# Altium schematic symbol library SparkFun.SCHLIB: 796 symbols (part 2 of 5)
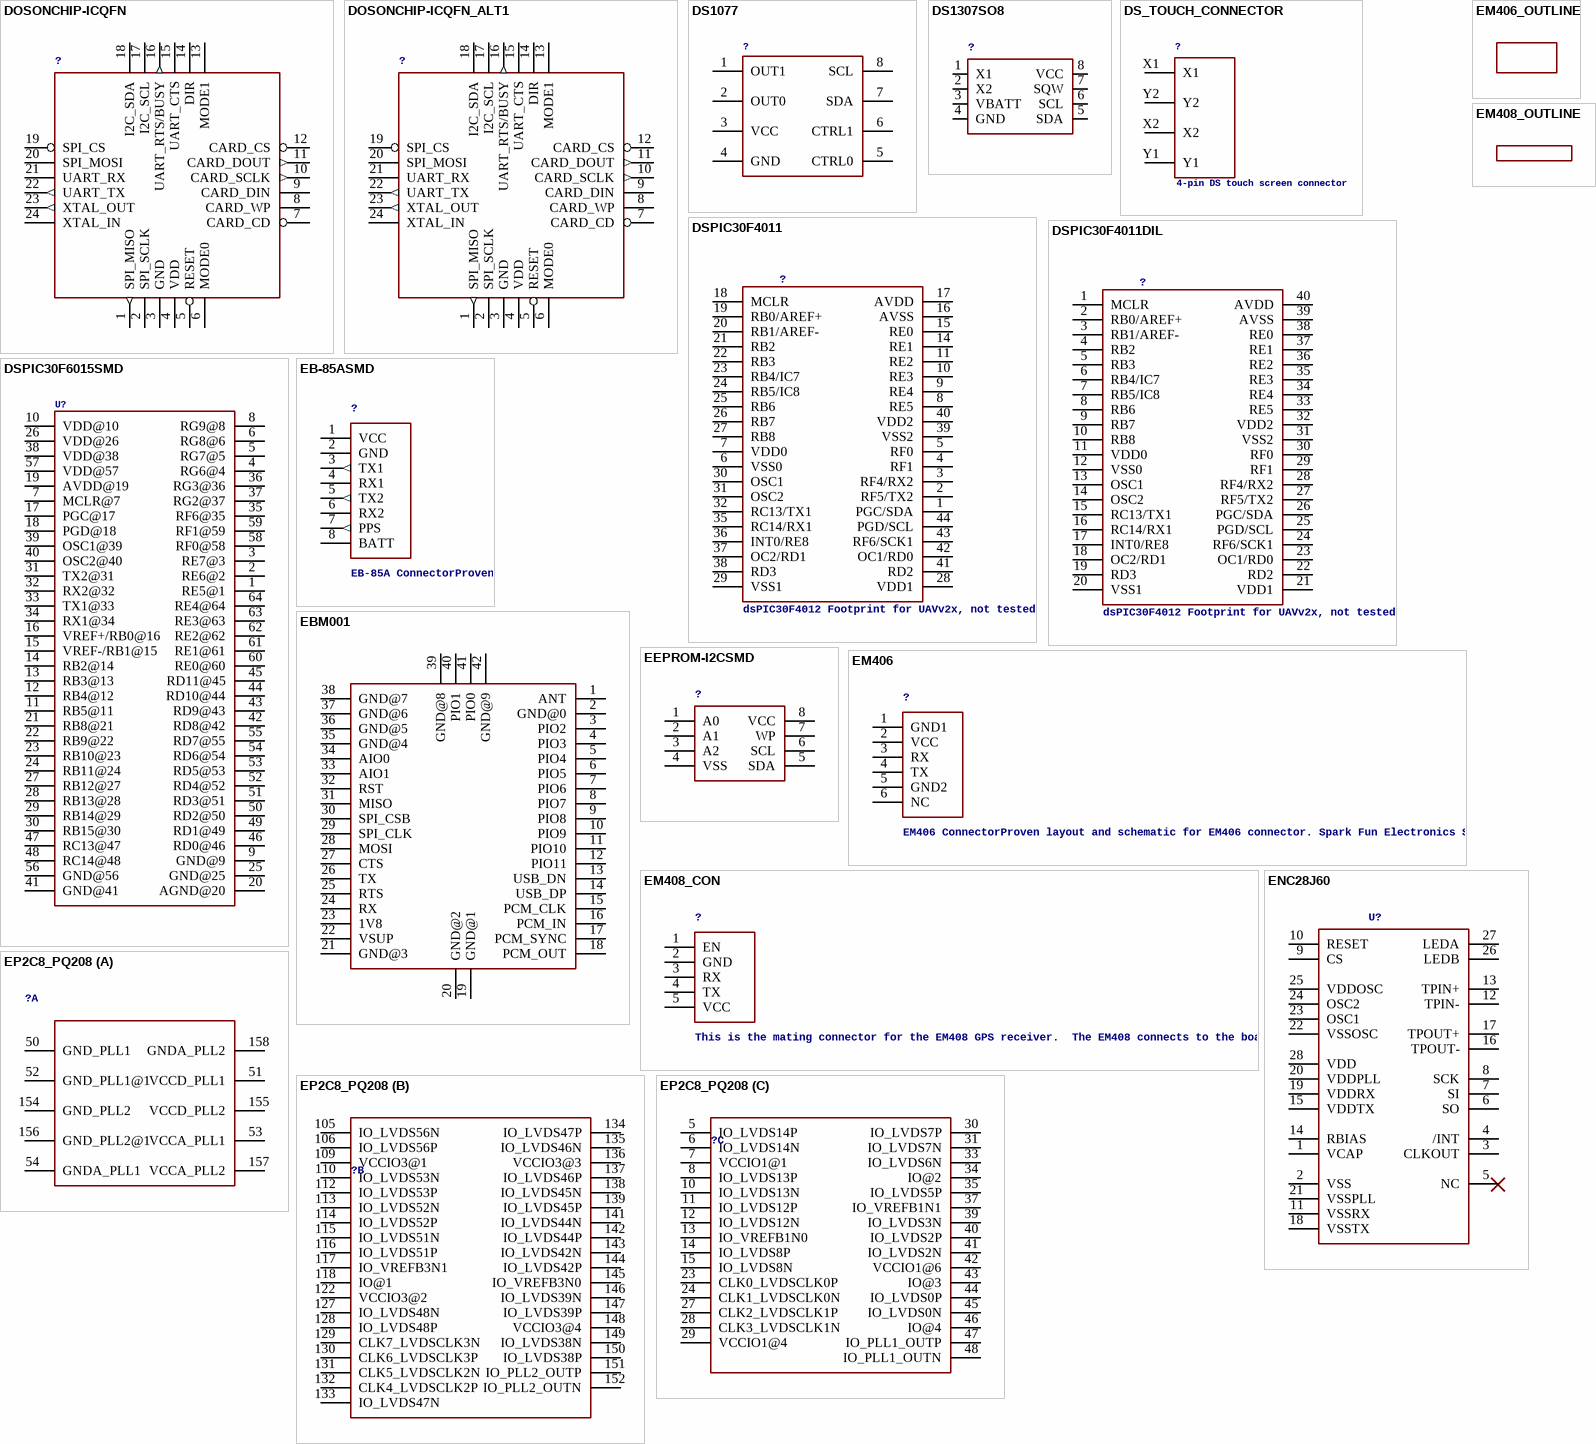
[diagram p37: symbols DOSONCHIP-ICQFN to EP2C8_PQ208]

## DOSONCHIP-ICQFN
designator ?, comment DOSonCHIP ICThis is the tested schematic and footprint for the DOSonCHIP FAT16 FAT32 IC. Spark Fun Electronics SKU : COM-07956. QFN package also tested/proven.  (value not drawn)
footprint QFN-24
pins: 1 SPI_MISO (out), 2 SPI_SCLK, 3 GND, 4 VDD, 5 RESET, 6 MODE0, 7 CARD_CD, 8 CARD_WP, 9 CARD_DIN, 10 CARD_SCLK (out), 11 CARD_DOUT (out), 12 CARD_CS, 13 MODE1, 14 DIR, 15 UART_CTS, 16 UART_RTS/BUSY (out), 17 I2C_SCL, 18 I2C_SDA, 19 SPI_CS, 20 SPI_MOSI, 21 UART_RX, 22 UART_TX (out), 23 XTAL_OUT (out), 24 XTAL_IN

## DOSONCHIP-ICQFN_ALT1
designator ?, comment DOSonCHIP ICThis is the tested schematic and footprint for the DOSonCHIP FAT16 FAT32 IC. Spark Fun Electronics SKU : COM-07956. QFN package also tested/proven.  (value not drawn)
footprint QFN-24_ALT1.PAC
pins: 1 SPI_MISO (out), 2 SPI_SCLK, 3 GND, 4 VDD, 5 RESET, 6 MODE0, 7 CARD_CD, 8 CARD_WP, 9 CARD_DIN, 10 CARD_SCLK (out), 11 CARD_DOUT (out), 12 CARD_CS, 13 MODE1, 14 DIR, 15 UART_CTS, 16 UART_RTS/BUSY (out), 17 I2C_SCL, 18 I2C_SDA, 19 SPI_CS, 20 SPI_MOSI, 21 UART_RX, 22 UART_TX (out), 23 XTAL_OUT (out), 24 XTAL_IN

## DS1077
designator ?
footprint SO08
pins: 1 OUT1, 2 OUT0, 3 VCC, 4 GND, 5 CTRL0, 6 CTRL1, 7 SDA, 8 SCL

## DS1307SO8
designator ?
footprint SO08
pins: 1 X1, 2 X2, 3 VBATT, 4 GND, 5 SDA, 6 SCL, 7 SQW, 8 VCC

## DS_TOUCH_CONNECTOR
designator ?, comment 4-pin DS touch screen connector
footprint DS_TOUCH_CONNECTOR
pins: X1, X2, Y1, Y2

## DSPIC30F4011
designator ?, comment dsPIC30F4012 Footprint for UAVv2x, not tested
footprint TQFP44
pins: 1 PGC/SDA, 2 RF5/TX2, 3 RF4/RX2, 4 RF1, 5 RF0, 6 VSS0, 7 VDD0, 8 RE5, 9 RE4, 10 RE3, 11 RE2, 14 RE1, 15 RE0, 16 AVSS, 17 AVDD, 18 MCLR, 19 RB0/AREF+, 20 RB1/AREF-, 21 RB2, 22 RB3, 23 RB4/IC7, 24 RB5/IC8, 25 RB6, 26 RB7, 27 RB8, 28 VDD1, 29 VSS1, 30 OSC1, 31 OSC2, 32 RC13/TX1, 35 RC14/RX1, 36 INT0/RE8, 37 OC2/RD1, 38 RD3, 39 VSS2, 40 VDD2, 41 RD2, 42 OC1/RD0, 43 RF6/SCK1, 44 PGD/SCL

## DSPIC30F4011DIL
designator ?, comment dsPIC30F4012 Footprint for UAVv2x, not tested
footprint DIL40
pins: 1 MCLR, 2 RB0/AREF+, 3 RB1/AREF-, 4 RB2, 5 RB3, 6 RB4/IC7, 7 RB5/IC8, 8 RB6, 9 RB7, 10 RB8, 11 VDD0, 12 VSS0, 13 OSC1, 14 OSC2, 15 RC13/TX1, 16 RC14/RX1, 17 INT0/RE8, 18 OC2/RD1, 19 RD3, 20 VSS1, 21 VDD1, 22 RD2, 23 OC1/RD0, 24 RF6/SCK1, 25 PGD/SCL, 26 PGC/SDA, 27 RF5/TX2, 28 RF4/RX2, 29 RF1, 30 RF0, 31 VSS2, 32 VDD2, 33 RE5, 34 RE4, 35 RE3, 36 RE2, 37 RE1, 38 RE0, 39 AVSS, 40 AVDD

## DSPIC30F6015SMD
designator U?
footprint TQFP64
pins: 1 RE5@1, 2 RE6@2, 3 RE7@3, 4 RG6@4, 5 RG7@5, 6 RG8@6, 7 MCLR@7, 8 RG9@8, 9 GND@9, 10 VDD@10, 11 RB5@11, 12 RB4@12, 13 RB3@13, 14 RB2@14, 15 VREF-/RB1@15, 16 VREF+/RB0@16, 17 PGC@17, 18 PGD@18, 19 AVDD@19, 20 AGND@20, 21 RB8@21, 22 RB9@22, 23 RB10@23, 24 RB11@24, 25 GND@25, 26 VDD@26, 27 RB12@27, 28 RB13@28, 29 RB14@29, 30 RB15@30, 31 TX2@31, 32 RX2@32, 33 TX1@33, 34 RX1@34, 35 RF6@35, 36 RG3@36, 37 RG2@37, 38 VDD@38, 39 OSC1@39, 40 OSC2@40, 41 GND@41, 42 RD8@42, 43 RD9@43, 44 RD10@44, 45 RD11@45, 46 RD0@46, 47 RC13@47, 48 RC14@48, 49 RD1@49, 50 RD2@50, 51 RD3@51, 52 RD4@52, 53 RD5@53, 54 RD6@54, 55 RD7@55, 56 GND@56, 57 VDD@57, 58 RF0@58, 59 RF1@59, 60 RE0@60, 61 RE1@61, 62 RE2@62, 63 RE3@63, 64 RE4@64

## EB-85ASMD
designator ?, comment EB-85A ConnectorProven layout and schematic for ETek 5Hz GPS receiver connector. Spark Fun Electronics SKU : GPS-08297
footprint EB-85A
pins: 1 VCC (power), 2 GND (power), 3 TX1 (out), 4 RX1, 5 TX2 (out), 6 RX2, 7 PPS (out), 8 BATT (power)

## EBM001
designator ?
footprint EMB001
pins: 1 ANT, 2 GND@0, 3 PIO2, 4 PIO3, 5 PIO4, 6 PIO5, 7 PIO6, 8 PIO7, 9 PIO8, 10 PIO9, 11 PIO10, 12 PIO11, 13 USB_DN, 14 USB_DP, 15 PCM_CLK, 16 PCM_IN, 17 PCM_SYNC, 18 PCM_OUT, 19 GND@1, 20 GND@2, 21 GND@3, 22 VSUP, 23 1V8, 24 RX, 25 RTS, 26 TX, 27 CTS, 28 MOSI, 29 SPI_CLK, 30 SPI_CSB, 31 MISO, 32 RST, 33 AIO1, 34 AIO0, 35 GND@4, 36 GND@5, 37 GND@6, 38 GND@7, 39 GND@8, 40 PIO1, 41 PIO0, 42 GND@9

## EEPROM-I2CSMD
designator ?
footprint SO08
pins: 1 A0, 2 A1, 3 A2, 4 VSS (power), 5 SDA, 6 SCL, 7 WP, 8 VCC (power)

## EM406
designator ?, comment EM406 ConnectorProven layout and schematic for EM406 connector. Spark Fun Electronics SKU : GPS-00579
footprint EM406
pins: 1 GND1, 2 VCC, 3 RX, 4 TX, 5 GND2, 6 NC

## EM406_OUTLINE
designator ?
footprint EM406_OUTLINE

## EM408_CON
designator ?, comment This is the mating connector for the EM408 GPS receiver.  The EM408 connects to the board via a cable, this connector footprint does not include the outline of the receiver. You should include the "EM408_Outline" device in your schematic if you are to use the EM408 in your design.
footprint EM408_CON
pins: 1 EN, 2 GND, 3 RX, 4 TX, 5 VCC

## EM408_OUTLINE
designator ?, comment This device is only the outline of the EM408 GPS receiver.  The device is intended to give the designer an idea of what how the receiver will fit on the board.  THIS DEVICE DOES NOT PROVIDE ANY ELECTRICAL CONNECTION TO THE BOARD!  Include the "EM408_CON" device in order to connect the EM408 to your design.  (value not drawn)
footprint EM408_OUTLINE

## ENC28J60
designator U?
footprint SSOP28DB
pins: 1 VCAP, 2 VSS, 3 CLKOUT, 4 /INT, 5 NC, 6 SO, 7 SI, 8 SCK, 9 CS, 10 RESET, 11 VSSRX, 12 TPIN-, 13 TPIN+, 14 RBIAS, 15 VDDTX, 16 TPOUT-, 17 TPOUT+, 18 VSSTX, 19 VDDRX, 20 VDDPLL, 21 VSSPLL, 22 VSSOSC, 23 OSC1, 24 OSC2, 25 VDDOSC, 26 LEDB, 27 LEDA, 28 VDD

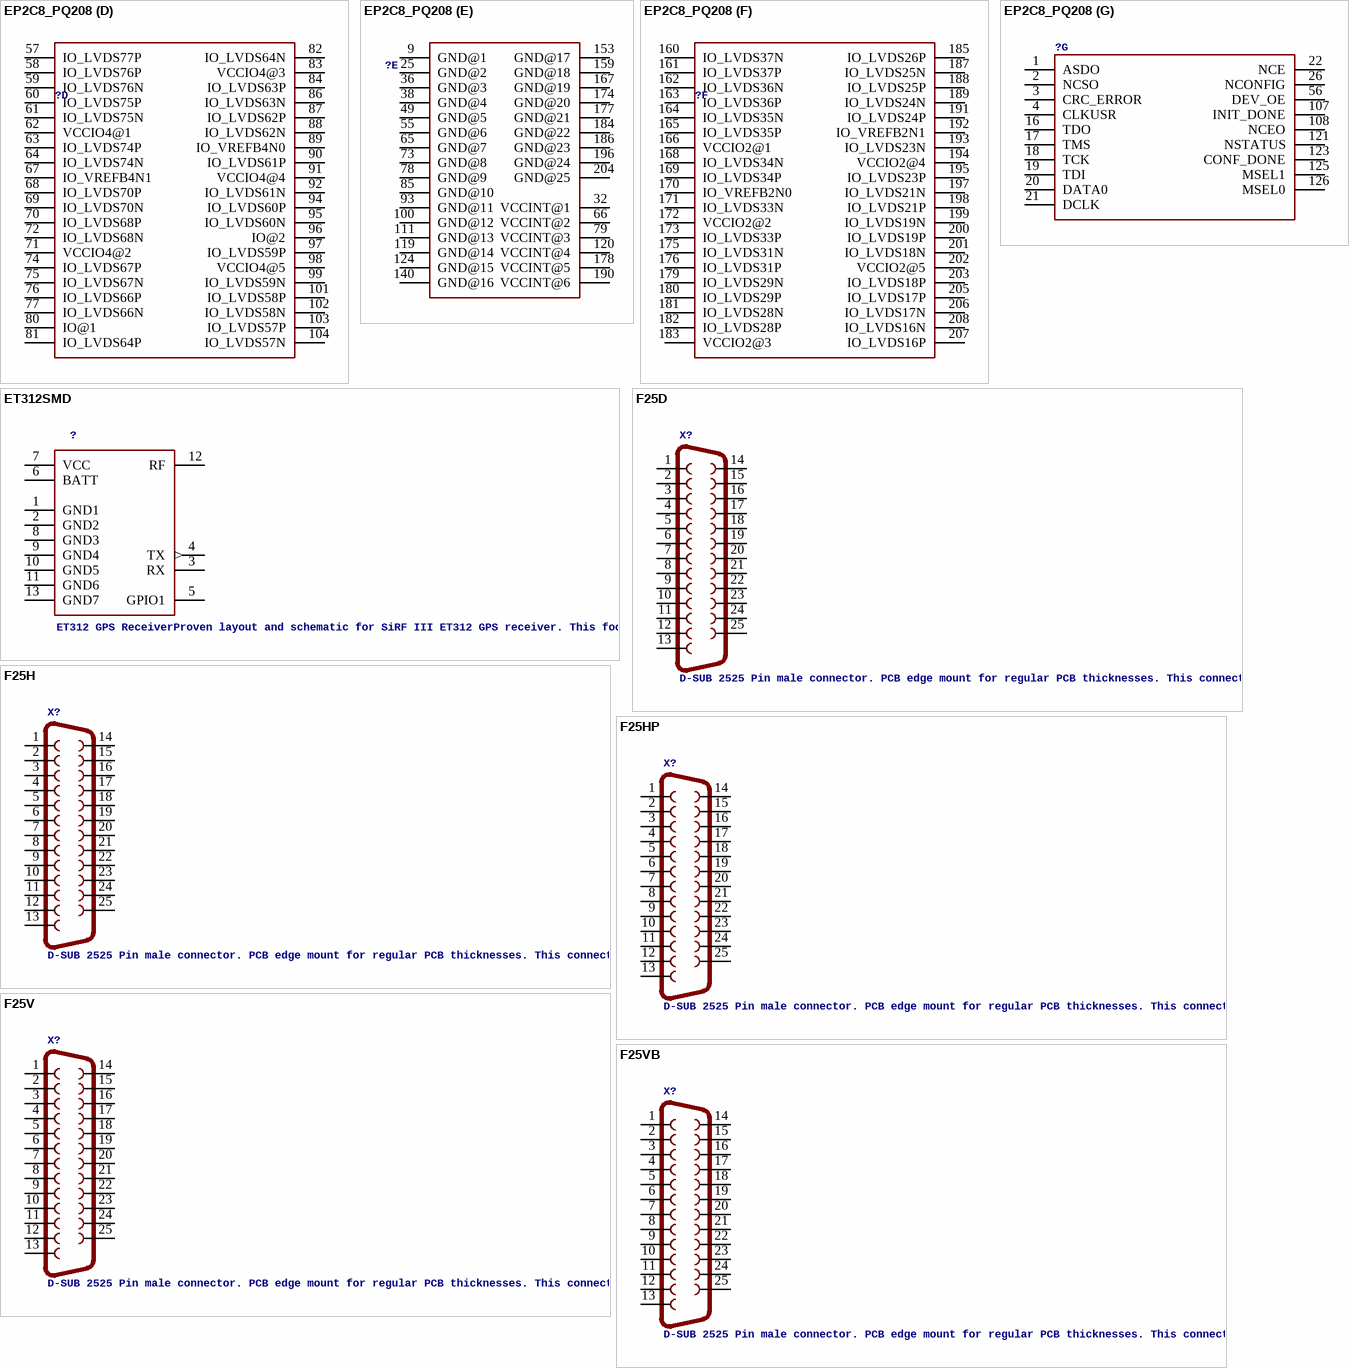
[diagram p12: symbols EP2C8_PQ208 to F25VB]

## EP2C8_PQ208
designator ?
footprint PQFP208
part A pins: 50 GND_PLL1 (power), 51 VCCD_PLL1 (power), 52 GND_PLL1@1 (power), 53 VCCA_PLL1 (power), 54 GNDA_PLL1 (power), 154 GND_PLL2 (power), 155 VCCD_PLL2 (power), 156 GND_PLL2@1 (power), 157 VCCA_PLL2 (power), 158 GNDA_PLL2 (power)
part B pins: 105 IO_LVDS56N, 106 IO_LVDS56P, 109 VCCIO3@1, 110 IO_LVDS53N, 112 IO_LVDS53P, 113 IO_LVDS52N, 114 IO_LVDS52P, 115 IO_LVDS51N, 116 IO_LVDS51P, 117 IO_VREFB3N1, 118 IO@1, 122 VCCIO3@2, 127 IO_LVDS48N, 128 IO_LVDS48P, 129 CLK7_LVDSCLK3N, 130 CLK6_LVDSCLK3P, 131 CLK5_LVDSCLK2N, 132 CLK4_LVDSCLK2P, 133 IO_LVDS47N, 134 IO_LVDS47P, 135 IO_LVDS46N, 136 VCCIO3@3, 137 IO_LVDS46P, 138 IO_LVDS45N, 139 IO_LVDS45P, 141 IO_LVDS44N, 142 IO_LVDS44P, 143 IO_LVDS42N, 144 IO_LVDS42P, 145 IO_VREFB3N0, 146 IO_LVDS39N, 147 IO_LVDS39P, 148 VCCIO3@4, 149 IO_LVDS38N, 150 IO_LVDS38P, 151 IO_PLL2_OUTP, 152 IO_PLL2_OUTN
part C pins: 5 IO_LVDS14P, 6 IO_LVDS14N, 7 VCCIO1@1, 8 IO_LVDS13P, 10 IO_LVDS13N, 11 IO_LVDS12P, 12 IO_LVDS12N, 13 IO_VREFB1N0, 14 IO_LVDS8P, 15 IO_LVDS8N, 23 CLK0_LVDSCLK0P, 24 CLK1_LVDSCLK0N, 27 CLK2_LVDSCLK1P, 28 CLK3_LVDSCLK1N, 29 VCCIO1@4, 30 IO_LVDS7P, 31 IO_LVDS7N, 33 IO_LVDS6N, 34 IO@2, 35 IO_LVDS5P, 37 IO_VREFB1N1, 39 IO_LVDS3N, 40 IO_LVDS2P, 41 IO_LVDS2N, 42 VCCIO1@6, 43 IO@3, 44 IO_LVDS0P, 45 IO_LVDS0N, 46 IO@4, 47 IO_PLL1_OUTP, 48 IO_PLL1_OUTN
part D pins: 57 IO_LVDS77P, 58 IO_LVDS76P, 59 IO_LVDS76N, 60 IO_LVDS75P, 61 IO_LVDS75N, 62 VCCIO4@1, 63 IO_LVDS74P, 64 IO_LVDS74N, 67 IO_VREFB4N1, 68 IO_LVDS70P, 69 IO_LVDS70N, 70 IO_LVDS68P, 71 VCCIO4@2, 72 IO_LVDS68N, 74 IO_LVDS67P, 75 IO_LVDS67N, 76 IO_LVDS66P, 77 IO_LVDS66N, 80 IO@1, 81 IO_LVDS64P, 82 IO_LVDS64N, 83 VCCIO4@3, 84 IO_LVDS63P, 86 IO_LVDS63N, 87 IO_LVDS62P, 88 IO_LVDS62N, 89 IO_VREFB4N0, 90 IO_LVDS61P, 91 VCCIO4@4, 92 IO_LVDS61N, 94 IO_LVDS60P, 95 IO_LVDS60N, 96 IO@2, 97 IO_LVDS59P, 98 VCCIO4@5, 99 IO_LVDS59N, 101 IO_LVDS58P, 102 IO_LVDS58N, 103 IO_LVDS57P, 104 IO_LVDS57N
part E pins: 9 GND@1 (power), 25 GND@2 (power), 32 VCCINT@1 (power), 36 GND@3 (power), 38 GND@4 (power), 49 GND@5 (power), 55 GND@6 (power), 65 GND@7 (power), 66 VCCINT@2 (power), 73 GND@8 (power), 78 GND@9 (power), 79 VCCINT@3 (power), 85 GND@10 (power), 93 GND@11 (power), 100 GND@12 (power), 111 GND@13 (power), 119 GND@14 (power), 120 VCCINT@4 (power), 124 GND@15, 140 GND@16, 153 GND@17, 159 GND@18, 167 GND@19, 174 GND@20, 177 GND@21, 178 VCCINT@5 (power), 184 GND@22, 186 GND@23, 190 VCCINT@6 (power), 196 GND@24, 204 GND@25
part F pins: 160 IO_LVDS37N, 161 IO_LVDS37P, 162 IO_LVDS36N, 163 IO_LVDS36P, 164 IO_LVDS35N, 165 IO_LVDS35P, 166 VCCIO2@1, 168 IO_LVDS34N, 169 IO_LVDS34P, 170 IO_VREFB2N0, 171 IO_LVDS33N, 172 VCCIO2@2, 173 IO_LVDS33P, 175 IO_LVDS31N, 176 IO_LVDS31P, 179 IO_LVDS29N, 180 IO_LVDS29P, 181 IO_LVDS28N, 182 IO_LVDS28P, 183 VCCIO2@3, 185 IO_LVDS26P, 187 IO_LVDS25N, 188 IO_LVDS25P, 189 IO_LVDS24N, 191 IO_LVDS24P, 192 IO_VREFB2N1, 193 IO_LVDS23N, 194 VCCIO2@4, 195 IO_LVDS23P, 197 IO_LVDS21N, 198 IO_LVDS21P, 199 IO_LVDS19N, 200 IO_LVDS19P, 201 IO_LVDS18N, 202 VCCIO2@5, 203 IO_LVDS18P, 205 IO_LVDS17P, 206 IO_LVDS17N, 207 IO_LVDS16P, 208 IO_LVDS16N
part G pins: 1 ASDO, 2 NCSO, 3 CRC_ERROR, 4 CLKUSR, 16 TDO, 17 TMS, 18 TCK, 19 TDI, 20 DATA0, 21 DCLK, 22 NCE, 26 NCONFIG, 56 DEV_OE, 107 INIT_DONE, 108 NCEO, 121 NSTATUS, 123 CONF_DONE, 125 MSEL1, 126 MSEL0

## ET312SMD
designator ?, comment ET312 GPS ReceiverProven layout and schematic for SiRF III ET312 GPS receiver. This footprint has been tweaked significantly to work with the ET312. This footprint has been fully qualified. Spark Fun Electronics SKU : GPS-08268.
footprint ET312
pins: 1 GND1 (power), 2 GND2 (power), 3 RX, 4 TX (out), 5 GPIO1, 6 BATT (power), 7 VCC (power), 8 GND3 (power), 9 GND4 (power), 10 GND5 (power), 11 GND6 (power), 12 RF, 13 GND7 (power)

## F25D
designator X?, comment D-SUB 2525 Pin male connector. PCB edge mount for regular PCB thicknesses. This connector will connect directly to the back of a PC parallel port or through a normal DB25 extension cable (M/F). SKU: PRT-08287
footprint F25D
pins: 1, 2, 3, 4, 5, 6, 7, 8, 9, 10, 11, 12, 13, 14, 15, 16, 17, 18, 19, 20, 21, 22, 23, 24, 25

## F25H
designator X?, comment D-SUB 2525 Pin male connector. PCB edge mount for regular PCB thicknesses. This connector will connect directly to the back of a PC parallel port or through a normal DB25 extension cable (M/F). SKU: PRT-08287
footprint F25H
pins: 1, 2, 3, 4, 5, 6, 7, 8, 9, 10, 11, 12, 13, 14, 15, 16, 17, 18, 19, 20, 21, 22, 23, 24, 25

## F25HP
designator X?, comment D-SUB 2525 Pin male connector. PCB edge mount for regular PCB thicknesses. This connector will connect directly to the back of a PC parallel port or through a normal DB25 extension cable (M/F). SKU: PRT-08287
footprint F25HP
pins: 1, 2, 3, 4, 5, 6, 7, 8, 9, 10, 11, 12, 13, 14, 15, 16, 17, 18, 19, 20, 21, 22, 23, 24, 25

## F25V
designator X?, comment D-SUB 2525 Pin male connector. PCB edge mount for regular PCB thicknesses. This connector will connect directly to the back of a PC parallel port or through a normal DB25 extension cable (M/F). SKU: PRT-08287
footprint F25V
pins: 1, 2, 3, 4, 5, 6, 7, 8, 9, 10, 11, 12, 13, 14, 15, 16, 17, 18, 19, 20, 21, 22, 23, 24, 25

## F25VB
designator X?, comment D-SUB 2525 Pin male connector. PCB edge mount for regular PCB thicknesses. This connector will connect directly to the back of a PC parallel port or through a normal DB25 extension cable (M/F). SKU: PRT-08287
footprint F25VB
pins: 1, 2, 3, 4, 5, 6, 7, 8, 9, 10, 11, 12, 13, 14, 15, 16, 17, 18, 19, 20, 21, 22, 23, 24, 25

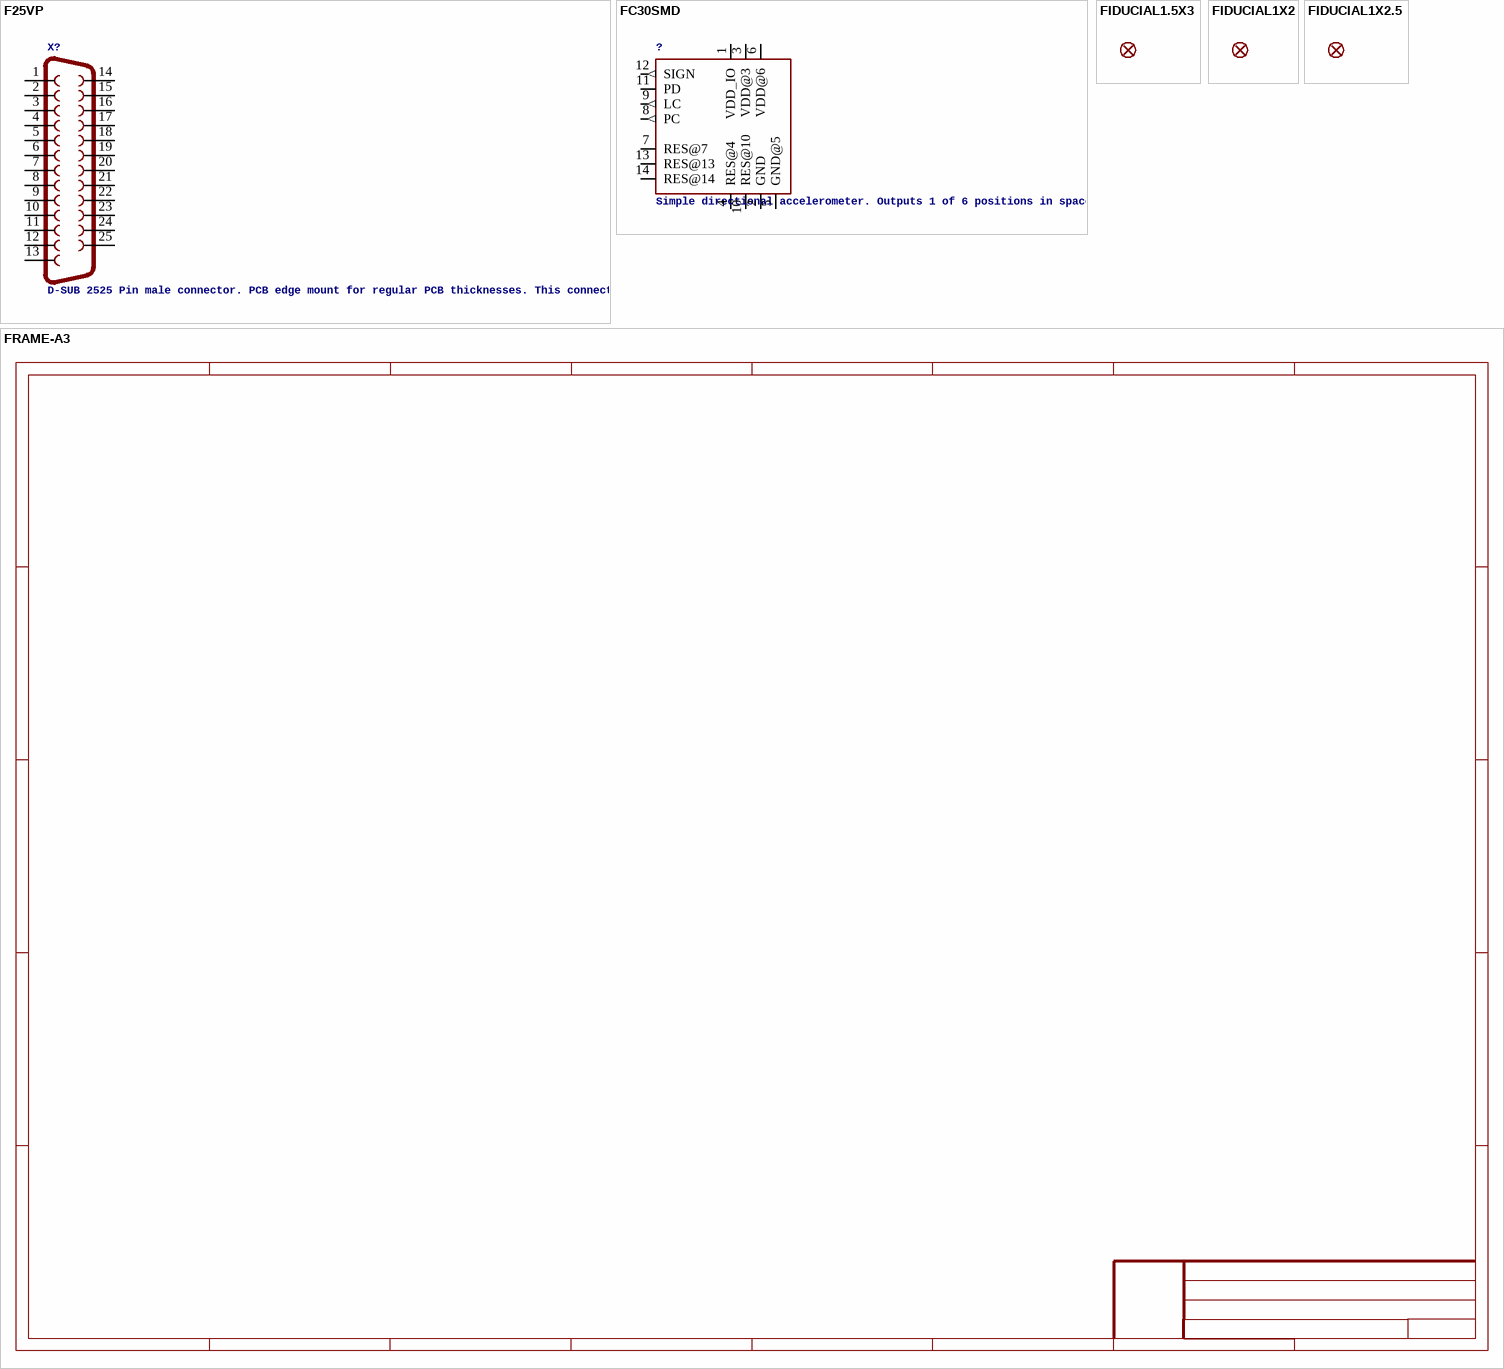
[diagram p13: symbols F25VP to FRAME-A3]

## F25VP
designator X?, comment D-SUB 2525 Pin male connector. PCB edge mount for regular PCB thicknesses. This connector will connect directly to the back of a PC parallel port or through a normal DB25 extension cable (M/F). SKU: PRT-08287
footprint F25VP
pins: 1, 2, 3, 4, 5, 6, 7, 8, 9, 10, 11, 12, 13, 14, 15, 16, 17, 18, 19, 20, 21, 22, 23, 24, 25

## FC30SMD
designator ?, comment Simple directional accelerometer. Outputs 1 of 6 positions in space.
footprint LGA14
pins: 1 VDD_IO (power), 2 GND (power), 3 VDD@3 (power), 4 RES@4 (power), 5 GND@5 (power), 6 VDD@6 (power), 7 RES@7, 8 PC (out), 9 LC (out), 10 RES@10 (power), 11 PD, 12 SIGN (out), 13 RES@13, 14 RES@14

## FIDUCIAL1.5X3
designator JP?, comment Fiducial Alignment PointsVarious fiducial points for machine vision alignment.  (value not drawn)
footprint FIDUCIAL-1.5X3

## FIDUCIAL1X2
designator JP?, comment Fiducial Alignment PointsVarious fiducial points for machine vision alignment.  (value not drawn)
footprint FIDUCIAL-1X2

## FIDUCIAL1X2.5
designator JP?, comment Fiducial Alignment PointsVarious fiducial points for machine vision alignment.  (value not drawn)
footprint FIDUCIAL-1X2.5

## FIO_LOGOV2
designator ?
footprint FUNNEL_LOGO_BOTTOM_V2

## FRAME-A3
designator FRAME?, comment Schematic Frame   A3 Larger Frame  (value not drawn)

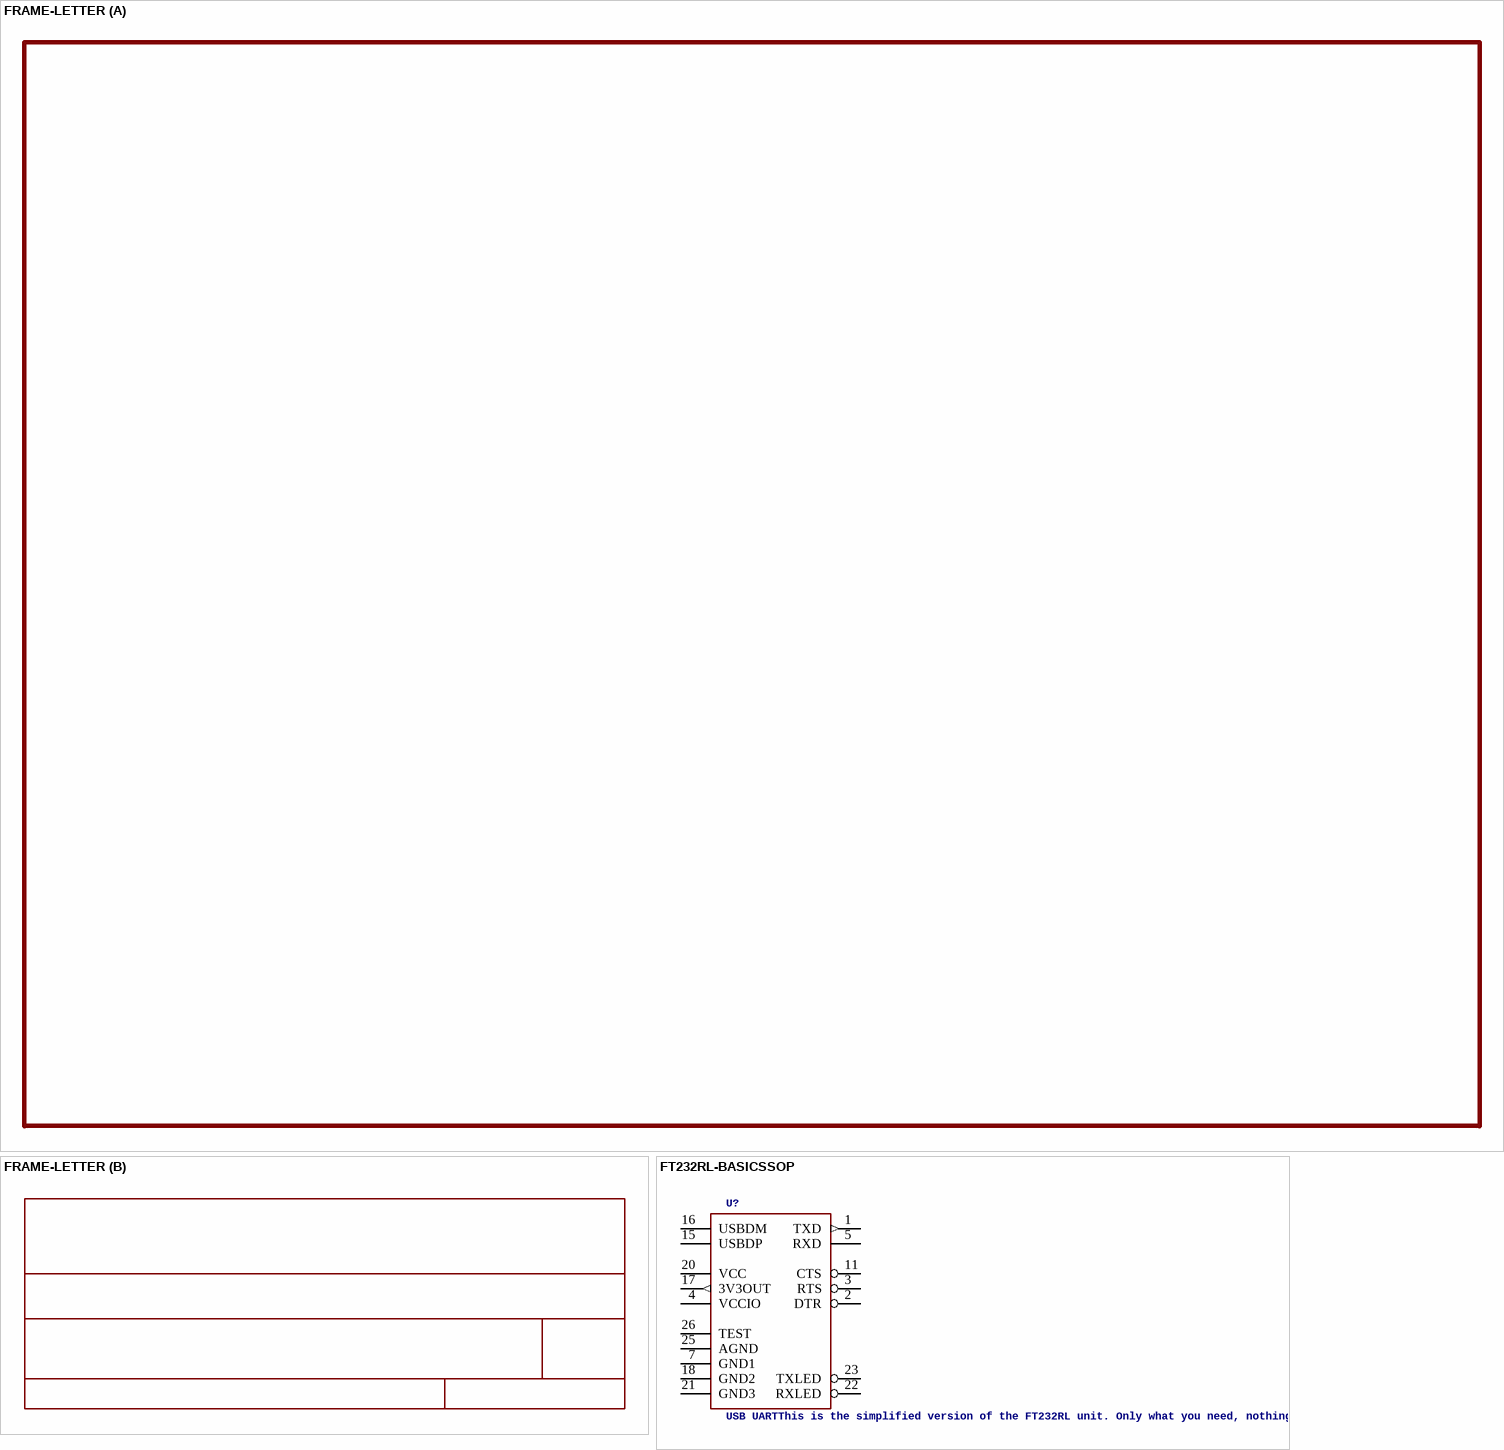
[diagram p14: symbols FRAME-LETTER to FT232RL-BASICSSOP]

## FRAME-LETTER
designator FRAME?, comment Schematic Frame   Standard 8.5x11 US Letter frame  (value not drawn)

## FT232RL-BASICSSOP
designator U?, comment USB UARTThis is the simplified version of the FT232RL unit. Only what you need, nothing you don't. Spark Fun Electronics SKU : COM-00650
footprint SSOP28DB
pins: 1 TXD (out), 2 DTR, 3 RTS, 4 VCCIO (power), 5 RXD, 7 GND1 (power), 11 CTS, 15 USBDP, 16 USBDM, 17 3V3OUT (out), 18 GND2 (power), 20 VCC (power), 21 GND3 (power), 22 RXLED, 23 TXLED, 25 AGND (power), 26 TEST
